# Altium integrated library Telephone.IntLib: 113 symbols (continued)
## CMP-009-00242-1
designator R?, comment value 330  (hidden comment: RC0603FR-07330RL)
Res Thick Film 0603 330 Ohm 1% 0.1W(1/10W) ±100ppm/C Pad SMD T/R; Manufacturer: Yageo; Manufacturer Part Number: RC0603FR-071K54L; Manufacturer: Mepco Philips; Voltage Rating: 50V; Max Power Dissipation: 100mW; Temperature Coefficient: 100ppm/°C; Case/Package: 0603; RoHS Compliant: Yes; Min Operating Temperature: -55°C; Max Operating Temperature: 155°C; Tolerance: 1%; Design Item ID: RC0603FR-071K54L; Case Code (Metric): 1608; Category: Chip SMD Resistors; Construction: Rectangular; Depth: 0.8mm; Features: Moisture Resistant; Height: 450um; Lead Free: Lead Free; Length: 1.6mm; Military Standard: Not; Number of Terminations: 2; Package Quantity: 1; Packaging: Cut Tape; Power Rating: 100mW; Pricing 1: 1=0.10000, 10=0.01800, 50=0.01800, 100=0.00600, 1000=0.00500, 10000=0.00300 (USD); Resistor Type: Thick Film; RoHS: Yes; Series: RC; Size Code: 0603; Stock 1: 61319; Termination: SMD/SMT; Voltage Rating (DC): 50V; Width: 800um; ComponentLink1Description: https://datasheet.ciiva.com/2454/pyu-r-int-thick-7-2454405.pdf?src-supplier=Digi-Key; ComponentLink1URL: https://datasheet.ciiva.com/2454/pyu-r-int-thick-7-2454405.pdf?src-supplier=Digi-Key; ComponentLink2Description: https://datasheet.ciiva.com/2454/pyu-r-int-thick-7-2454406.pdf?src-supplier=Digi-Key; ComponentLink2URL: https://datasheet.ciiva.com/2454/pyu-r-int-thick-7-2454406.pdf?src-supplier=Digi-Key; ComponentLink3Description: https://datasheet.ciiva.com/2454/pyu-r-int-thick-7-2454407.pdf?src-supplier=Digi-Key; ComponentLink3URL: https://datasheet.ciiva.com/2454/pyu-r-int-thick-7-2454407.pdf?src-supplier=Digi-Key; Pins: 2; Manufacturer Part Number: RC0603FR-07330RL; Component Type: Resistors
footprint R0603
pins: 1, 2

## CMP-009-00285-2
designator R?, comment value 10  (hidden comment: 1-2176230-4)
Res Thick Film 2512 10 Ohm 5% 3W ±200ppm/C Pad SMD T/R; Manufacturer: TE Connectivity CGS; Manufacturer: TE Connectivity; Manufacturer Part Number: 352210RJT; Temperature Coefficient: 200ppm/°C; Voltage Rating: 250V; Number of Resistors: 1; Manufacturer Part Number: 1-2176230-4; RoHS: Yes; Category: Uncategorized; Stock 1: 23105; Pricing 1: 1=0.73, 10=0.617, 50=0.617, 100=0.414, 1000=0.243, 10000=0.2 (USD); Mount: Surface Mount; Case/Package: 2512; Case Code (Metric): 6432; Min Operating Temperature: -55°C; Max Operating Temperature: 105°C; Packaging: Tape and Reel; Tolerance: 5%; Number of Terminations: 2; Series: 3522; Power Rating: 3W; Termination: Solder; Resistor Type: Thick Film,Power resistor; Voltage Rating (DC): 250V; Technology: THICK FILM; Resistance Tolerance: 5%; Length: 6.35mm; Height: 1.1mm; Depth: 3.2mm; RoHS Compliant: Yes; Reach SVHC Compliant: Unknown; ComponentLink1URL: http://www.farnell.com/datasheets/2007092.pdf?src-supplier=Farnell; ComponentLink1Description: http://www.farnell.com/datasheets/2007092.pdf?src-supplier=Farnell; ComponentLink2URL: http://uk.rs-online.com/webdocs/142d/0900766b8142d0f1.pdf?src-supplier=Rs; ComponentLink2Description: http://uk.rs-online.com/webdocs/142d/0900766b8142d0f1.pdf?src-supplier=Rs; ComponentLink3URL: https://www.te.com/commerce/DocumentDelivery/DDEController?Action=srchrtrv&DocNm=9-1773463-7&DocType=DS&DocLang=English&src-supplier=Digi-Key; ComponentLink3Description: https://www.te.com/commerce/DocumentDelivery/DDEController?Action=srchrtrv&DocNm=9-1773463-7&DocType=DS&DocLang=English&src-supplier=Digi-Key; ComponentLink4URL: http://www.te.com/commerce/DocumentDelivery/DDEController?Action=srchrtrv&DocNm=9-1773463-7&DocType=DS&DocLang=English&src-supplier=Digi-Key; ComponentLink4Description: http://www.te.com/commerce/DocumentDelivery/DDEController?Action=srchrtrv&DocNm=9-1773463-7&DocType=DS&DocLang=English&src-supplier=Digi-Key; ComponentLink5URL: http://www.farnell.com/datasheets/2007092.pdf?src-supplier=Newark; ComponentLink5Description: http://www.farnell.com/datasheets/2007092.pdf?src-supplier=Newark; Design Item ID: 1-2176230-4; Component Type: Standard; Pin Count: 2; Source: V4-TEL.SCHLIB; Component Type: Resistors
footprint R2512 (Molded Resistor, 2-Leads, Body 6.4x3.2mm, IPC Medium Density)
pins: 1, 2

## CMP-009-00287-2
designator R?, comment value 56  (hidden comment: 4-1879501-3)
Res Thick Film 2512 56 Ohm 5% 2W ±100ppm/°C Molded SMD SMD T/R; Manufacturer: TE Connectivity; Voltage Rating: 200V; Number of Resistors: 1; Manufacturer Part Number: 4-1879501-3; Stock: 3706; Mounting Technology: Surface Mount; Case/Package: 2512; Case Code (Metric): 6432; Min Operating Temperature: -55°C; Max Operating Temperature: 155°C; Packaging: Cut Tape; Tolerance: 5%; Temperature Coefficient: 100ppm/°C; Number of Terminations: 2; Series: CRGH; Resistor Type: Power resistor; Voltage Rating (DC): 200V; Termination: Solder; Resistance Tolerance: 5%; Technology: THICK FILM; Length: 6.35mm; Height: 0.55mm; Depth: 3.2mm; RoHS Compliant: Yes; Reach SVHC Compliant: No; ComponentLink1URL: https://datasheet.ciiva.com/12564/ng-ds-1773204-g-214560-12564976.pdf?src-supplier=Mouser; ComponentLink1Description: https://datasheet.ciiva.com/12564/ng-ds-1773204-g-214560-12564976.pdf?src-supplier=Mouser; ComponentLink2URL: https://datasheet.ciiva.com/48778/1755795-48778268.pdf?src-supplier=Element14; ComponentLink2Description: https://datasheet.ciiva.com/48778/1755795-48778268.pdf?src-supplier=Element14; ComponentLink3URL: https://datasheet.ciiva.com/48777/1755795-48777694.pdf?src-supplier=Element14; ComponentLink3Description: https://datasheet.ciiva.com/48777/1755795-48777694.pdf?src-supplier=Element14; Component Type: Standard; Pins: 2; Power: 2W; Case Code (Imperial): 2512; Component Type: Resistors
footprint R2512 (Molded Resistor, 2-Leads, Body 6.4x3.2mm, IPC Medium Density)
pins: 1, 2

## CMP-009-00289-1
designator R?  value 1.2k  (hidden comment: CMP-009-00289-1)
Res Thick Film 0805 1.2K Ohm 1% 0.125W(1/8W) ±100ppm/C Molded SMD Paper Tape on Plastic Reel; Manufacturer: Bourns; Manufacturer Part Number: CR0805-FX-1201ELF; Power Rating: 125mW; Voltage Rating: 150V; Temperature Coefficient: 100ppm/°C; RoHS: Yes; Category: Chip SMD Resistors; Stock 1: 89998; Pricing 1: 1=0.1, 10=0.029, 50=0.029, 100=0.012, 1000=0.006, 10000=0.003 (USD); Mount: Surface Mount; Case/Package: 0805; Case Code (Metric): 2012; Contact Plating: Tin; Min Operating Temperature: -55°C; Max Operating Temperature: 155°C; Package Quantity: 5000; Packaging: Tape and Reel; Tolerance: 1%; Number of Terminations: 2; Termination: SMD/SMT; Max Power Dissipation: 125mW; Features: Moisture Resistant; Series: CR0805; Length: 0.079inch; Width: 1.25mm; Height: 0.024inch; Thickness: 508um; Radiation Hardening: No; RoHS Compliant: Yes; ComponentLink1URL: https://datasheet.ciiva.com/9123/chpreztr-9123541.pdf?src-supplier=Avnet; ComponentLink1Description: https://datasheet.ciiva.com/9123/chpreztr-9123541.pdf?src-supplier=Avnet; ComponentLink2URL: https://datasheet.ciiva.com/5581/chpreztr-5581383.pdf?src-supplier=Mouser; ComponentLink2Description: https://datasheet.ciiva.com/5581/chpreztr-5581383.pdf?src-supplier=Mouser; Design Item ID: CR0805-FX-1201ELF; Component Type: Standard; Pin Count: 2; Source: V4-TEL.SCHLIB; Component Type: Resistors
footprint 0805
pins: 1, 2

## CMP-009-00290-1
designator R?  value 13  (hidden comment: CMP-009-00290-1)
Res Thick Film 0805 13 Ohm 1% 1/8W ±100ppm/°C Molded SMD SMD Paper Tape on Plastic Reel; Manufacturer: Bourns; Manufacturer Part Number: CR0805-FX-13R0ELF; Power Rating: 125mW; Voltage Rating: 150V; RoHS: Yes; Category: Chip SMD Resistors; Stock 1: 53715; Pricing 1: 1=0.1, 10=0.029, 50=0.029, 100=0.012, 1000=0.006, 10000=0.003 (USD); Mount: Surface Mount; Case/Package: 0805; Case Code (Metric): 2012; Contact Plating: Tin; Min Operating Temperature: -55°C; Max Operating Temperature: 155°C; Packaging: Tape and Reel; Tolerance: 1%; Package Quantity: 5000; Number of Terminations: 2; Termination: SMD/SMT; Temperature Coefficient: 100ppm/°C; Max Power Dissipation: 125mW; Features: Moisture Resistant; Series: CR0805; Length: 0.079inch; Width: 1.25mm; Height: 0.024inch; Thickness: 508um; Radiation Hardening: No; RoHS Compliant: Yes; ComponentLink1URL: https://datasheet.ciiva.com/5577/chpreztr-5577813.pdf?src-supplier=Mouser; ComponentLink1Description: https://datasheet.ciiva.com/5577/chpreztr-5577813.pdf?src-supplier=Mouser; ComponentLink2URL: https://datasheet.ciiva.com/9122/chpreztr-9122173.pdf?src-supplier=Avnet; ComponentLink2Description: https://datasheet.ciiva.com/9122/chpreztr-9122173.pdf?src-supplier=Avnet; Design Item ID: CR0805-FX-13R0ELF; Component Type: Standard; Pin Count: 2; Source: V4-TEL.SCHLIB; Component Type: Resistors
footprint 0805
pins: 1, 2

## CMP-009-00291-1
designator R?  value 200  (hidden comment: CMP-009-00291-1)
Res Thick Film 0805 200 Ohm 1% 1/8W ±100ppm/°C Molded SMD SMD Paper Tape on Plastic Reel; Manufacturer: Bourns; Manufacturer Part Number: CR0805-FX-2000ELF; Power Rating: 125mW; Voltage Rating: 150V; RoHS: Yes; Category: Chip SMD Resistors; Stock 1: 115698; Pricing 1: 1=0.1, 10=0.029, 50=0.029, 100=0.012, 1000=0.006, 10000=0.003 (USD); Mount: Surface Mount; Case/Package: 0805; Case Code (Metric): 2012; Contact Plating: Tin; Min Operating Temperature: -55°C; Max Operating Temperature: 155°C; Packaging: Tape and Reel; Tolerance: 1%; Package Quantity: 5000; Termination: SMD/SMT; Temperature Coefficient: 100ppm/°C; Features: Moisture Resistant; Series: CR0805; Max Power Dissipation: 125mW; Number of Terminations: 2; Length: 2mm; Width: 1.25mm; Height: 0.5mm; Thickness: 508um; Radiation Hardening: No; RoHS Compliant: Yes; ComponentLink1URL: http://components.arrow.com/part/dataview/40998293S2126022N1506?src-supplier=Arrow+Electronics; ComponentLink1Description: http://components.arrow.com/part/dataview/40998293S2126022N1506?src-supplier=Arrow+Electronics; ComponentLink2URL: http://www.farnell.com/datasheets/2178762.pdf?src-supplier=Farnell; ComponentLink2Description: http://www.farnell.com/datasheets/2178762.pdf?src-supplier=Farnell; ComponentLink3URL: http://www.mouser.com/ds/2/54/chpreztr-977002.pdf?src-supplier=Mouser; ComponentLink3Description: http://www.mouser.com/ds/2/54/chpreztr-977002.pdf?src-supplier=Mouser; ComponentLink4URL: http://www.farnell.com/datasheets/2178762.pdf?src-supplier=Newark; ComponentLink4Description: http://www.farnell.com/datasheets/2178762.pdf?src-supplier=Newark; ComponentLink5URL: http://www.bourns.com/pdfs/chpreztr.pdf?src-supplier=Avnet; ComponentLink5Description: http://www.bourns.com/pdfs/chpreztr.pdf?src-supplier=Avnet; ComponentLink6URL: https://www.bourns.com/docs/Product-Datasheets/CHPREZTR.pdf?src-supplier=Digi-Key; ComponentLink6Description: https://www.bourns.com/docs/Product-Datasheets/CHPREZTR.pdf?src-supplier=Digi-Key; ComponentLink7URL: http://www.onlinecomponents.com/datasheet/cr0805-fx-2000elf.aspx?p=10745564&src-supplier=Onlinecomponents.com; ComponentLink7Description: http://www.onlinecomponents.com/datasheet/cr0805-fx-2000elf.aspx?p=10745564&src-supplier=Onlinecomponents.com; Design Item ID: CR0805-FX-2000ELF; Component Type: Standard; Pin Count: 2; Source: V4-TEL.SCHLIB; Component Type: Resistors
footprint 0805
pins: 1, 2

## CMP-009-00292-1
designator R?  value 2.7k  (hidden comment: CMP-009-00292-1)
Res Thick Film 0805 2.7K Ohm 1% 1/8W ±100ppm/°C Molded SMD SMD Paper Tape on Plastic Reel; Manufacturer: Bourns; Manufacturer Part Number: CR0805-FX-2701ELF; Power Rating: 125mW; Voltage Rating: 150V; RoHS: Yes; Category: Chip SMD Resistors; Stock 1: 44241; Pricing 1: 1=0.1, 10=0.029, 50=0.029, 100=0.012, 1000=0.006, 10000=0.003 (USD); Mount: Surface Mount; Case/Package: 0805; Case Code (Metric): 2012; Contact Plating: Tin; Min Operating Temperature: -55°C; Max Operating Temperature: 155°C; Packaging: Tape and Reel; Package Quantity: 5000; Tolerance: 1%; Termination: SMD/SMT; Number of Terminations: 2; Temperature Coefficient: 100ppm/°C; Max Power Dissipation: 125mW; Features: Moisture Resistant; Series: CR0805; Length: 0.079inch; Width: 1.25mm; Height: 0.024inch; Thickness: 508um; Radiation Hardening: No; RoHS Compliant: Yes; ComponentLink1URL: https://datasheet.ciiva.com/9123/chpreztr-9123127.pdf?src-supplier=Avnet; ComponentLink1Description: https://datasheet.ciiva.com/9123/chpreztr-9123127.pdf?src-supplier=Avnet; ComponentLink2URL: https://datasheet.ciiva.com/18608/chpreztr-18608504.pdf?src-supplier=Digi-Key; ComponentLink2Description: https://datasheet.ciiva.com/18608/chpreztr-18608504.pdf?src-supplier=Digi-Key; ComponentLink3URL: https://datasheet.ciiva.com/18608/chpreztr-18608505.pdf?src-supplier=Digi-Key; ComponentLink3Description: https://datasheet.ciiva.com/18608/chpreztr-18608505.pdf?src-supplier=Digi-Key; ComponentLink4URL: https://datasheet.ciiva.com/18608/chpreztr-18608506.pdf?src-supplier=Digi-Key; ComponentLink4Description: https://datasheet.ciiva.com/18608/chpreztr-18608506.pdf?src-supplier=Digi-Key; Design Item ID: CR0805-FX-2701ELF; Component Type: Standard; Pin Count: 2; Source: V4-TEL.SCHLIB; Component Type: Resistors
footprint 0805
pins: 1, 2

## CMP-009-00293-1
designator R?  value 300  (hidden comment: CMP-009-00293-1)
Res Thick Film 0805 300 Ohm 1% 1/8W ±100ppm/°C Molded SMD SMD Paper Tape on Plastic Reel; Manufacturer: Bourns; Manufacturer Part Number: CR0805-FX-3000ELF; Power Rating: 125mW; Voltage Rating: 150V; RoHS: Yes; Category: Chip SMD Resistors; Stock 1: 32741; Pricing 1: 1=0.1, 10=0.034, 50=0.034, 100=0.014, 1000=0.007, 10000=0.003 (USD); Mount: Surface Mount; Case/Package: 0805; Case Code (Metric): 2012; Contact Plating: Tin; Min Operating Temperature: -55°C; Max Operating Temperature: 155°C; Packaging: Tape and Reel; Tolerance: 1%; Package Quantity: 1; Termination: SMD/SMT; Number of Terminations: 2; Temperature Coefficient: 100ppm/°C; Max Power Dissipation: 125mW; Features: Moisture Resistant; Series: CR0805; Length: 0.079inch; Width: 1.25mm; Height: 0.024inch; Thickness: 508um; Radiation Hardening: No; RoHS Compliant: Yes; ComponentLink1URL: https://datasheet.ciiva.com/18608/chpreztr-18608507.pdf?src-supplier=Digi-Key; ComponentLink1Description: https://datasheet.ciiva.com/18608/chpreztr-18608507.pdf?src-supplier=Digi-Key; ComponentLink2URL: https://datasheet.ciiva.com/18608/chpreztr-18608508.pdf?src-supplier=Digi-Key; ComponentLink2Description: https://datasheet.ciiva.com/18608/chpreztr-18608508.pdf?src-supplier=Digi-Key; ComponentLink3URL: https://datasheet.ciiva.com/18608/chpreztr-18608509.pdf?src-supplier=Digi-Key; ComponentLink3Description: https://datasheet.ciiva.com/18608/chpreztr-18608509.pdf?src-supplier=Digi-Key; Design Item ID: CR0805-FX-3000ELF; Component Type: Standard; Pin Count: 2; Source: V4-TEL.SCHLIB; Component Type: Resistors
footprint 0805
pins: 1, 2

## CMP-009-00294-1
designator R?  value 1.5M  (hidden comment: CMP-009-00294-1)
Thick Film Resistors 1.5M 5%; Manufacturer: Bourns; Manufacturer Part Number: CR0805-JW-155ELF; Power Rating: 125mW; Voltage Rating: 150V; Temperature Coefficient: 200ppm/°C; RoHS: Yes; Category: Chip SMD Resistors; Stock 1: 77505; Pricing 1: 1=0.1, 10=0.024, 50=0.024, 100=0.01, 1000=0.005, 10000=0.004 (USD); Mount: Surface Mount; Case/Package: 0805; Case Code (Metric): 2012; Contact Plating: Tin; Min Operating Temperature: -55°C; Max Operating Temperature: 155°C; Packaging: Tape and Reel; Package Quantity: 5000; Tolerance: 5%; Termination: SMD/SMT; Number of Terminations: 2; Max Power Dissipation: 125mW; Features: Moisture Resistant; Series: CR0805; Length: 0.079inch; Width: 1.25mm; Height: 0.024inch; Thickness: 508um; Radiation Hardening: No; RoHS Compliant: Yes; ComponentLink1URL: https://datasheet.ciiva.com/5545/chpreztr-5545126.pdf?src-supplier=Mouser; ComponentLink1Description: https://datasheet.ciiva.com/5545/chpreztr-5545126.pdf?src-supplier=Mouser; ComponentLink2URL: https://datasheet.ciiva.com/18608/chpreztr-18608456.pdf?src-supplier=Digi-Key; ComponentLink2Description: https://datasheet.ciiva.com/18608/chpreztr-18608456.pdf?src-supplier=Digi-Key; ComponentLink3URL: https://datasheet.ciiva.com/18608/chpreztr-18608457.pdf?src-supplier=Digi-Key; ComponentLink3Description: https://datasheet.ciiva.com/18608/chpreztr-18608457.pdf?src-supplier=Digi-Key; ComponentLink4URL: https://datasheet.ciiva.com/18608/chpreztr-18608458.pdf?src-supplier=Digi-Key; ComponentLink4Description: https://datasheet.ciiva.com/18608/chpreztr-18608458.pdf?src-supplier=Digi-Key; ComponentLink5URL: https://datasheet.ciiva.com/9123/chpreztr-9123419.pdf?src-supplier=Avnet; ComponentLink5Description: https://datasheet.ciiva.com/9123/chpreztr-9123419.pdf?src-supplier=Avnet; Design Item ID: CR0805-JW-155ELF; Component Type: Standard; Pin Count: 2; Source: V4-TEL.SCHLIB; Component Type: Resistors
footprint 0805
pins: 1, 2

## CMP-009-00295-1
designator R?  value 2k  (hidden comment: CMP-009-00295-1)
Res Thick Film 0805 2K Ohm 5% 1/8W ±200ppm/°C Molded SMD SMD Paper Tape on Plastic Reel; Manufacturer: Bourns; Manufacturer Part Number: CR0805-JW-202ELF; Power Rating: 125mW; Voltage Rating: 150V; RoHS: Yes; Category: Chip SMD Resistors; Stock 1: 147283; Pricing 1: 1=0.1, 10=0.024, 50=0.024, 100=0.01, 1000=0.005, 10000=0.003 (USD); Mount: Surface Mount; Case/Package: 0805; Case Code (Metric): 2012; Contact Plating: Tin; Min Operating Temperature: -55°C; Max Operating Temperature: 155°C; Tolerance: 5%; Packaging: Tape and Reel; Package Quantity: 1; Resistor Type: Thick Film; Termination: SMD/SMT; Number of Terminations: 2; Temperature Coefficient: 200ppm/°C; Max Power Dissipation: 125mW; Voltage Rating (DC): 150V; Features: Moisture Resistant; Series: CR0805; Resistance Tolerance: 5%; Length: 0.079inch; Width: 1.25mm; Height: 0.024inch; Thickness: 508um; Radiation Hardening: No; Reach SVHC Compliant: No; RoHS Compliant: Yes; ComponentLink1URL: https://datasheet.ciiva.com/18594/chpreztr-18594853.pdf?src-supplier=Digi-Key; ComponentLink1Description: https://datasheet.ciiva.com/18594/chpreztr-18594853.pdf?src-supplier=Digi-Key; ComponentLink2URL: https://datasheet.ciiva.com/18594/chpreztr-18594854.pdf?src-supplier=Digi-Key; ComponentLink2Description: https://datasheet.ciiva.com/18594/chpreztr-18594854.pdf?src-supplier=Digi-Key; ComponentLink3URL: https://datasheet.ciiva.com/18594/chpreztr-18594855.pdf?src-supplier=Digi-Key; ComponentLink3Description: https://datasheet.ciiva.com/18594/chpreztr-18594855.pdf?src-supplier=Digi-Key; Design Item ID: CR0805-JW-202ELF; Component Type: Standard; Pin Count: 2; Source: V4-TEL.SCHLIB; Component Type: Resistors
footprint 0805
pins: 1, 2

## CMP-009-00296-1
designator R?  value 2.2k  (hidden comment: CMP-009-00296-1)
Res Thick Film 0805 2.2K Ohm 5% 1/8W ±200ppm/°C Molded SMD SMD Paper Tape on Plastic Reel; Manufacturer: Bourns; Manufacturer Part Number: CR0805-JW-222ELF; Power Rating: 125mW; Voltage Rating: 150V; RoHS: Yes; Category: Chip SMD Resistors; Stock 1: 107619; Pricing 1: 1=0.1, 10=0.024, 50=0.024, 100=0.01, 1000=0.005, 10000=0.003 (USD); Mount: Surface Mount; Case/Package: 0805; Case Code (Metric): 2012; Contact Plating: Tin; Min Operating Temperature: -55°C; Max Operating Temperature: 155°C; Packaging: Tape and Reel; Tolerance: 5%; Package Quantity: 1; Resistor Type: Thick Film; Termination: SMD/SMT; Number of Terminations: 2; Temperature Coefficient: 200ppm/°C; Max Power Dissipation: 125mW; Voltage Rating (DC): 150V; Features: Moisture Resistant; Series: CR0805; Resistance Tolerance: 5%; Length: 0.079inch; Width: 1.25mm; Height: 0.024inch; Thickness: 508um; Radiation Hardening: No; Reach SVHC Compliant: No; RoHS Compliant: Yes; ComponentLink1URL: https://datasheet.ciiva.com/5547/chpreztr-26488-5547975.pdf?src-supplier=Mouser; ComponentLink1Description: https://datasheet.ciiva.com/5547/chpreztr-26488-5547975.pdf?src-supplier=Mouser; ComponentLink2URL: https://datasheet.ciiva.com/6547/chpreztr-6547353.pdf?src-supplier=Digi-Key; ComponentLink2Description: https://datasheet.ciiva.com/6547/chpreztr-6547353.pdf?src-supplier=Digi-Key; ComponentLink3URL: https://datasheet.ciiva.com/6547/chpreztr-6547354.pdf?src-supplier=Digi-Key; ComponentLink3Description: https://datasheet.ciiva.com/6547/chpreztr-6547354.pdf?src-supplier=Digi-Key; ComponentLink4URL: https://datasheet.ciiva.com/6547/chpreztr-6547355.pdf?src-supplier=Digi-Key; ComponentLink4Description: https://datasheet.ciiva.com/6547/chpreztr-6547355.pdf?src-supplier=Digi-Key; Design Item ID: CR0805-JW-222ELF; Component Type: Standard; Pin Count: 2; Source: V4-TEL.SCHLIB; Component Type: Resistors
footprint 0805
pins: 1, 2

## CMP-009-00298-1
designator R?  value 1.5k  (hidden comment: CMP-009-00298-1)
Res Thick Film 0805 1.5K Ohm 5% 1/8W ±200ppm/°C Molded SMD SMD Paper T/R; Manufacturer: Vishay Dale; Manufacturer Part Number: CRCW08051K50JNEA; Power Rating: 125mW; Voltage Rating: 150V; RoHS: Yes; Category: Chip SMD Resistors; Stock 1: 18838; Pricing 1: 1=0.1, 10=0.05, 50=0.05, 100=0.021, 1000=0.01, 10000=0.006 (USD); Case/Package: 0805; Weight: 0.000194oz; Case Code (Metric): 2012; Contact Plating: Tin; Size Code: 0805; Min Operating Temperature: -55°C; Max Operating Temperature: 155°C; Tolerance: 5%; Packaging: Tape and Reel; Package Quantity: 5000; Termination: SMD/SMT; Resistor Type: Thick Film; Temperature Coefficient: 200ppm/°C; Voltage Rating (DC): 150V; Features: Automotive AEC-Q200; Series: CRCW; Max Power Dissipation: 125mW; Number of Terminations: 2; Construction: Rectangular; Resistance Tolerance: 5%; Length: 2mm; Width: 1.25mm; Height: 0.45mm; Depth: 1.25mm; Radiation Hardening: No; Military Standard: Not; Lead Free: Lead Free; RoHS Compliant: Yes; Reach SVHC Compliant: Unknown; ComponentLink1URL: https://datasheet.ciiva.com/16780/70201119-16780055.pdf?src-supplier=Allied+Electronics; ComponentLink1Description: https://datasheet.ciiva.com/16780/70201119-16780055.pdf?src-supplier=Allied+Electronics; ComponentLink2URL: https://datasheet.ciiva.com/9100/dcrcwe3-9100360.pdf?src-supplier=Avnet; ComponentLink2Description: https://datasheet.ciiva.com/9100/dcrcwe3-9100360.pdf?src-supplier=Avnet; Design Item ID: CRCW08051K50JNEA; Component Type: Standard; Pin Count: 2; Source: V4-TEL.SCHLIB; Component Type: Resistors
footprint 0805
pins: 1, 2

## CMP-009-00299-1
designator R?  value 1.8k  (hidden comment: CMP-009-00299-1)
Res Thick Film 0805 1.8K Ohm 5% 1/8W ±200ppm/°C Molded SMD SMD Paper T/R; Manufacturer: Vishay Dale; Manufacturer Part Number: CRCW08051K80JNEA; Power Rating: 125mW; Voltage Rating: 150V; RoHS: Yes; Category: Chip SMD Resistors; Stock 1: 4900; Pricing 1: 1=0.1, 10=0.05, 50=0.05, 100=0.021, 1000=0.01, 10000=0.005 (USD); Case/Package: 0805; Contact Plating: Tin; Weight: 0.000194oz; Case Code (Metric): 2012; Size Code: 0805; Min Operating Temperature: -55°C; Max Operating Temperature: 155°C; Tolerance: 5%; Temperature Coefficient: 200ppm/°C; Packaging: Cut Tape; Resistor Type: Thick Film; Number of Terminations: 2; Termination: SMD/SMT; Max Power Dissipation: 125mW; Features: Automotive AEC-Q200; Series: CRCW; Package Quantity: 1; Voltage Rating (DC): 150V; Resistance Tolerance: 5%; Length: 0.079inch; Width: 0.049inch; Height: 0.02inch; Radiation Hardening: No; Lead Free: Lead Free; RoHS Compliant: Yes; Reach SVHC Compliant: Unknown; ComponentLink1URL: https://datasheet.ciiva.com/2464/dcrcwe3-2464848.pdf?src-supplier=Digi-Key; ComponentLink1Description: https://datasheet.ciiva.com/2464/dcrcwe3-2464848.pdf?src-supplier=Digi-Key; ComponentLink2URL: https://datasheet.ciiva.com/22872/70201119-22872346.pdf?src-supplier=Allied+Electronics; ComponentLink2Description: https://datasheet.ciiva.com/22872/70201119-22872346.pdf?src-supplier=Allied+Electronics; ComponentLink3URL: https://datasheet.ciiva.com/16390/dcrcw-16390924.pdf?src-supplier=Future+Electronics; ComponentLink3Description: https://datasheet.ciiva.com/16390/dcrcw-16390924.pdf?src-supplier=Future+Electronics; ComponentLink4URL: https://datasheet.ciiva.com/3258/dcrcwe3-3258269.pdf?src-supplier=Avnet; ComponentLink4Description: https://datasheet.ciiva.com/3258/dcrcwe3-3258269.pdf?src-supplier=Avnet; ComponentLink5URL: https://datasheet.ciiva.com/2464/dcrcwe3-2464846.pdf?src-supplier=Digi-Key; ComponentLink5Description: https://datasheet.ciiva.com/2464/dcrcwe3-2464846.pdf?src-supplier=Digi-Key; ComponentLink6URL: https://datasheet.ciiva.com/3258/dcrcwe3-3258270.pdf?src-supplier=Avnet; ComponentLink6Description: https://datasheet.ciiva.com/3258/dcrcwe3-3258270.pdf?src-supplier=Avnet; ComponentLink7URL: https://datasheet.ciiva.com/2464/dcrcwe3-2464847.pdf?src-supplier=Digi-Key; ComponentLink7Description: https://datasheet.ciiva.com/2464/dcrcwe3-2464847.pdf?src-supplier=Digi-Key; Design Item ID: CRCW08051K80JNEA; Component Type: Standard; Pin Count: 2; Source: V4-TEL.SCHLIB; Component Type: Resistors
footprint 0805
pins: 1, 2

## CMP-009-00300-1
designator R?  value 1 M  (hidden comment: CMP-009-00300-1)
Res Thick Film 0805 1M Ohm 5% 0.125W(1/8W) ±200ppm/°C Pad SMD T/R; Manufacturer: Vishay; Manufacturer Part Number: CRCW08051M00JNEAC; RoHS: No; Category: Chip SMD Resistors; Stock 1: 24891; Pricing 1: 1=0.1, 10=0.042, 50=0.042, 100=0.017, 1000=0.008, 10000=0.005 (USD); Design Item ID: CRCW08051M00JNEAC; Component Type: Standard; Pin Count: 2; Source: V4-TEL.SCHLIB; Component Type: Resistors
footprint 0805
pins: 1, 2

## CMP-009-00301-2
designator R?, comment value 680  (hidden comment: CRCW0805680RJNEBC)
CRCW Thick Film Commodity Chip Resistor 0805 Size 680 Ohm 5% 0.125 W 200 ppm/K 2-Pin SMD Paper T/R; Manufacturer: Vishay; Power: 125mW; Manufacturer Part Number: CRCW0805680RJNEBC; Category: Chip SMD Resistors; Mounting Technology: SMT; Pins: 2; RoHS Compliant: No; Tolerance: 5%; Component Type: Resistors
footprint R0805
pins: 1, 2

## CMP-009-00302-1
designator R?  value 8.2k  (hidden comment: CMP-009-00302-1)
Res Thick Film 0805 8.2K Ohm 5% 1/8W ±200ppm/°C Molded SMD SMD Paper T/R; Manufacturer: Vishay Dale; Manufacturer Part Number: CRCW08058K20JNEA; Power Rating: 125mW; Voltage Rating: 150V; RoHS: Yes; Category: Chip SMD Resistors; Stock 1: 5125; Pricing 1: 1=0.1, 10=0.05, 50=0.05, 100=0.021, 1000=0.01, 10000=0.006 (USD); Case/Package: 0805; Weight: 0.000194oz; Case Code (Metric): 2012; Contact Plating: Tin; Size Code: 0805; Min Operating Temperature: -55°C; Max Operating Temperature: 155°C; Tolerance: 5%; Packaging: Tape and Reel; Package Quantity: 1; Resistor Type: Thick Film; Number of Terminations: 2; Max Power Dissipation: 125mW; Temperature Coefficient: 200ppm/°C; Voltage Rating (DC): 150V; Features: Automotive AEC-Q200; Series: CRCW; Resistance Tolerance: 5%; Termination: SMD/SMT; Technology: THICK FILM; Length: 2mm; Width: 0.049inch; Height: 0.45mm; Depth: 1.25mm; Radiation Hardening: No; Lead Free: Lead Free; RoHS Compliant: Yes; Reach SVHC Compliant: Unknown; ComponentLink1URL: https://datasheet.ciiva.com/2464/dcrcwe3-2464855.pdf?src-supplier=Digi-Key; ComponentLink1Description: https://datasheet.ciiva.com/2464/dcrcwe3-2464855.pdf?src-supplier=Digi-Key; ComponentLink2URL: https://datasheet.ciiva.com/2464/dcrcwe3-2464856.pdf?src-supplier=Digi-Key; ComponentLink2Description: https://datasheet.ciiva.com/2464/dcrcwe3-2464856.pdf?src-supplier=Digi-Key; ComponentLink3URL: https://datasheet.ciiva.com/2464/dcrcwe3-2464857.pdf?src-supplier=Digi-Key; ComponentLink3Description: https://datasheet.ciiva.com/2464/dcrcwe3-2464857.pdf?src-supplier=Digi-Key; ComponentLink4URL: https://datasheet.ciiva.com/16397/dcrcwe3-16397273.pdf?src-supplier=Future+Electronics; ComponentLink4Description: https://datasheet.ciiva.com/16397/dcrcwe3-16397273.pdf?src-supplier=Future+Electronics; ComponentLink5URL: https://datasheet.ciiva.com/5550/dcrcwe3-109170-5550397.pdf?src-supplier=Mouser; ComponentLink5Description: https://datasheet.ciiva.com/5550/dcrcwe3-109170-5550397.pdf?src-supplier=Mouser; ComponentLink6URL: https://datasheet.ciiva.com/9056/dcrcwe3-9056269.pdf?src-supplier=Avnet; ComponentLink6Description: https://datasheet.ciiva.com/9056/dcrcwe3-9056269.pdf?src-supplier=Avnet; ComponentLink7URL: https://datasheet.ciiva.com/16773/70201119-16773566.pdf?src-supplier=Allied+Electronics; ComponentLink7Description: https://datasheet.ciiva.com/16773/70201119-16773566.pdf?src-supplier=Allied+Electronics; ComponentLink8URL: https://datasheet.ciiva.com/9056/dcrcwe3-9056271.pdf?src-supplier=Avnet; ComponentLink8Description: https://datasheet.ciiva.com/9056/dcrcwe3-9056271.pdf?src-supplier=Avnet; Design Item ID: CRCW08058K20JNEA; Component Type: Standard; Pin Count: 2; Source: V4-TEL.SCHLIB; Component Type: Resistors
footprint 0805
pins: 1, 2

## CMP-009-00303-1
designator R?  value 30  (hidden comment: CMP-009-00303-1)
Res Thick Film 0603 30 Ohm 1% 0.2W(1/5W) ±200ppm/°C Molded SMD Punched Carrier T/R; Manufacturer: Panasonic; Manufacturer Part Number: ERJP03F30R0V; Power Rating: 200mW; Voltage Rating: 150V; RoHS: Yes; Category: Chip SMD Resistors; Stock 1: 2224; Pricing 1: 1=0.36, 10=0.264, 50=0.264, 100=0.126, 1000=0.052, 10000=0.04 (USD); Mount: Surface Mount; Case/Package: 0603; Case Code (Metric): 1608; Min Operating Temperature: -55°C; Max Operating Temperature: 155°C; Tolerance: 1%; Packaging: Tape and Reel; Package Quantity: 5000; Resistor Type: Thick Film; Temperature Coefficient: 200ppm/°C; Voltage Rating (DC): 150V; Termination: Tab; Features: Automotive AEC-Q200; Series: ERJ; Max Power Dissipation: 200mW; Number of Terminations: 2; Resistance Tolerance: 1%; Technology: THICK FILM; Length: 1.6mm; Width: 0.8mm; Height: 0.45mm; Depth: 0.8mm; Ratings: AEC-Q200; Reach SVHC Compliant: No; RoHS Compliant: Yes; ComponentLink1URL: https://datasheet.ciiva.com/11817/0900766b812cb812-11817099.pdf?src-supplier=Rs; ComponentLink1Description: https://datasheet.ciiva.com/11817/0900766b812cb812-11817099.pdf?src-supplier=Rs; ComponentLink2URL: https://datasheet.ciiva.com/48426/erjp-series-eng-tds-48426890.pdf?src-supplier=Distrelec; ComponentLink2Description: https://datasheet.ciiva.com/48426/erjp-series-eng-tds-48426890.pdf?src-supplier=Distrelec; ComponentLink3URL: https://datasheet.ciiva.com/48537/erjp-series-eng-tds-48537514.pdf?src-supplier=Distrelec; ComponentLink3Description: https://datasheet.ciiva.com/48537/erjp-series-eng-tds-48537514.pdf?src-supplier=Distrelec; ComponentLink4URL: https://datasheet.ciiva.com/22739/1790600-22739766.pdf?src-supplier=Element14; ComponentLink4Description: https://datasheet.ciiva.com/22739/1790600-22739766.pdf?src-supplier=Element14; ComponentLink5URL: https://datasheet.ciiva.com/24032/aoa0000ce4-64075-24032235.pdf?src-supplier=Mouser; ComponentLink5Description: https://datasheet.ciiva.com/24032/aoa0000ce4-64075-24032235.pdf?src-supplier=Mouser; Pins: 2; Design Item ID: ERJP03F30R0V; Component Type: Standard; Pin Count: 2; Source: V4-TEL.SCHLIB; Component Type: Resistors
footprint 0603
pins: 1, 2

## CMP-009-00305-1
designator R?  value 0  (hidden comment: CMP-009-00305-1)
RC Series 0805 0.125 W 0 Ohm Jumper SMT Thick Film Chip Resistor; Manufacturer: Yageo; Manufacturer Part Number: RC0805FR-070RL; Tolerance: 1%; Power Rating: 125mW; RoHS: Yes; Category: Chip SMD Resistors; Stock 1: 550673; Pricing 1: 1=0.1, 10=0.039, 50=0.039, 100=0.016, 1000=0.008, 10000=0.004 (USD); Case/Package: 0805; Contact Plating: Tin,Matte; Case Code (Metric): 2012; Size Code: 0805; Min Operating Temperature: -55°C; Max Operating Temperature: 155°C; Packaging: Tape and Reel; Features: Moisture Resistant; Series: RC; Max Power Dissipation: 125mW; Number of Terminations: 2; Construction: Rectangular; Length: 2mm; Depth: 1.25mm; Military Standard: Not; Lead Free: Lead Free; RoHS Compliant: Yes; ComponentLink1URL: https://datasheet.ciiva.com/15189/getdatasheetpartid-348154-15189885.pdf?src-supplier=Verical; ComponentLink1Description: https://datasheet.ciiva.com/15189/getdatasheetpartid-348154-15189885.pdf?src-supplier=Verical; ComponentLink2URL: https://datasheet.ciiva.com/17042/rc0805-17042698.pdf?src-supplier=Future+Electronics; ComponentLink2Description: https://datasheet.ciiva.com/17042/rc0805-17042698.pdf?src-supplier=Future+Electronics; Design Item ID: RC0805FR-070RL; Component Type: Standard; Pin Count: 2; Source: V4-TEL.SCHLIB; Component Type: Resistors
footprint 0805
pins: 1, 2

## CMP-009-00306-1
designator R?  value 12k  (hidden comment: CMP-009-00306-1)
Res Thick Film 0805 12K Ohm 1% 0.125W(1/8W) ±100ppm/C Pad SMD T/R; Manufacturer: Yageo; Manufacturer Part Number: RC0805FR-0712KL; Temperature Coefficient: 100ppm/°C; Power Rating: 125mW; Voltage Rating: 150V; RoHS: Yes; Category: Chip SMD Resistors; Stock 1: 240573; Pricing 1: 1=0.1, 10=0.024, 50=0.024, 100=0.012, 1000=0.007, 10000=0.004 (USD); Case/Package: 0805; Case Code (Metric): 2012; Weight: 0.000194oz; Size Code: 0805; Min Operating Temperature: -55°C; Max Operating Temperature: 155°C; Tolerance: 1%; Packaging: Cut Tape; Resistor Type: Thick Film; Package Quantity: 1; Termination: SMD/SMT; Number of Terminations: 2; Max Power Dissipation: 125mW; Features: Moisture Resistant; Series: RC; Resistance Tolerance: 1%; Length: 0.079inch; Width: 0.049inch; Height: 0.024inch; Lead Free: Lead Free; Reach SVHC Compliant: Unknown; RoHS Compliant: Yes; ComponentLink1URL: https://datasheet.ciiva.com/2519/pyu-r-int-thick-7-2519832.pdf?src-supplier=Digi-Key; ComponentLink1Description: https://datasheet.ciiva.com/2519/pyu-r-int-thick-7-2519832.pdf?src-supplier=Digi-Key; ComponentLink2URL: https://datasheet.ciiva.com/2519/pyu-r-int-thick-7-2519833.pdf?src-supplier=Digi-Key; ComponentLink2Description: https://datasheet.ciiva.com/2519/pyu-r-int-thick-7-2519833.pdf?src-supplier=Digi-Key; ComponentLink3URL: https://datasheet.ciiva.com/2519/pyu-r-int-thick-7-2519831.pdf?src-supplier=Digi-Key; ComponentLink3Description: https://datasheet.ciiva.com/2519/pyu-r-int-thick-7-2519831.pdf?src-supplier=Digi-Key; ComponentLink4URL: https://datasheet.ciiva.com/12577/rc0805-12577253.pdf?src-supplier=Mouser; ComponentLink4Description: https://datasheet.ciiva.com/12577/rc0805-12577253.pdf?src-supplier=Mouser; ComponentLink5URL: https://datasheet.ciiva.com/7941/444164-7941693.pdf?src-supplier=Element14; ComponentLink5Description: https://datasheet.ciiva.com/7941/444164-7941693.pdf?src-supplier=Element14; ComponentLink6URL: https://datasheet.ciiva.com/7941/444164-7941694.pdf?src-supplier=Element14; ComponentLink6Description: https://datasheet.ciiva.com/7941/444164-7941694.pdf?src-supplier=Element14; ComponentLink7URL: https://datasheet.ciiva.com/17018/rc0805-17018634.pdf?src-supplier=Future+Electronics; ComponentLink7Description: https://datasheet.ciiva.com/17018/rc0805-17018634.pdf?src-supplier=Future+Electronics; Design Item ID: RC0805FR-0712KL; Component Type: Standard; Pin Count: 2; Source: V4-TEL.SCHLIB; Component Type: Resistors
footprint 0805
pins: 1, 2

## CMP-009-00307-1
designator R?  value 200k  (hidden comment: CMP-009-00307-1)
Res Thick Film 0805 200K Ohm 1% 1/8W ±100ppm/°C Molded SMD Paper T/R; Manufacturer: Yageo; Manufacturer Part Number: RC0805FR-07200KL; Power Rating: 125mW; Voltage Rating: 150V; RoHS: Yes; Category: Chip SMD Resistors; Stock 1: 312674; Pricing 1: 1=0.1, 10=0.033, 50=0.033, 100=0.014, 1000=0.006, 10000=0.003 (USD); Case/Package: 0805; Case Code (Metric): 2012; Contact Plating: Tin,Matte; Min Operating Temperature: -55°C; Max Operating Temperature: 155°C; Tolerance: 1%; Packaging: Tape and Reel; Termination: SMD/SMT; Resistor Type: Thick Film; Temperature Coefficient: 100ppm/°C; Voltage Rating (DC): 150V; Working Voltage: 150V; Number of Terminations: 2; Features: Moisture Resistant; Series: RC; Max Power Dissipation: 125mW; Resistance Tolerance: 1%; Technology: THICK FILM; Construction: Rectangular; Length: 2mm; Height: 0.5mm; Depth: 1.25mm; Reach SVHC Compliant: No; Military Standard: Not; Lead Free: Lead Free; RoHS Compliant: Yes; ComponentLink1URL: https://datasheet.ciiva.com/46395/444164-46395126.pdf?src-supplier=Element14; ComponentLink1Description: https://datasheet.ciiva.com/46395/444164-46395126.pdf?src-supplier=Element14; ComponentLink2URL: https://datasheet.ciiva.com/12668/rc0805-12668200.pdf?src-supplier=Mouser; ComponentLink2Description: https://datasheet.ciiva.com/12668/rc0805-12668200.pdf?src-supplier=Mouser; ComponentLink3URL: https://datasheet.ciiva.com/15189/getdatasheetpartid-71710-15189925.pdf?src-supplier=Verical; ComponentLink3Description: https://datasheet.ciiva.com/15189/getdatasheetpartid-71710-15189925.pdf?src-supplier=Verical; Pins: 2; Design Item ID: RC0805FR-07200KL; Component Type: Standard; Pin Count: 2; Source: V4-TEL.SCHLIB; Component Type: Resistors
footprint 0805
pins: 1, 2

## CMP-009-00308-1
designator R?  value 330k  (hidden comment: CMP-009-00308-1)
Res Thick Film 0805 330K Ohm 1% 1/8W ±100ppm/°C Molded SMD Paper T/R; Manufacturer: Yageo; Manufacturer Part Number: RC0805FR-07330KL; Power Rating: 125mW; Voltage Rating: 150V; RoHS: Yes; Category: Chip SMD Resistors; Stock 1: 220926; Pricing 1: 1=0.1, 10=0.033, 50=0.033, 100=0.014, 1000=0.007, 10000=0.003 (USD); Case/Package: 0805; Case Code (Metric): 2012; Contact Plating: Tin,Matte; Size Code: 0805; Min Operating Temperature: -55°C; Max Operating Temperature: 155°C; Tolerance: 1%; Package Quantity: 1; Packaging: Tape and Reel; Resistor Type: Thick Film; Number of Terminations: 2; Termination: SMD/SMT; Temperature Coefficient: 100ppm/°C; Max Power Dissipation: 125mW; Features: Moisture Resistant; Series: RC; Resistance Tolerance: 1%; Construction: Rectangular; Technology: THICK FILM; Length: 0.079inch; Width: 0.049inch; Height: 0.024inch; Depth: 1.25mm; Military Standard: Not; Lead Free: Lead Free; RoHS Compliant: Yes; Reach SVHC Compliant: Unknown; ComponentLink1URL: https://datasheet.ciiva.com/2457/pyu-r-int-thick-7-2457090.pdf?src-supplier=Digi-Key; ComponentLink1Description: https://datasheet.ciiva.com/2457/pyu-r-int-thick-7-2457090.pdf?src-supplier=Digi-Key; ComponentLink2URL: https://datasheet.ciiva.com/2457/pyu-r-int-thick-7-2457091.pdf?src-supplier=Digi-Key; ComponentLink2Description: https://datasheet.ciiva.com/2457/pyu-r-int-thick-7-2457091.pdf?src-supplier=Digi-Key; ComponentLink3URL: https://datasheet.ciiva.com/2457/pyu-r-int-thick-7-2457089.pdf?src-supplier=Digi-Key; ComponentLink3Description: https://datasheet.ciiva.com/2457/pyu-r-int-thick-7-2457089.pdf?src-supplier=Digi-Key; ComponentLink4URL: https://datasheet.ciiva.com/12667/rc0805-12667006.pdf?src-supplier=Mouser; ComponentLink4Description: https://datasheet.ciiva.com/12667/rc0805-12667006.pdf?src-supplier=Mouser; ComponentLink5URL: https://datasheet.ciiva.com/7941/444164-7941766.pdf?src-supplier=Element14; ComponentLink5Description: https://datasheet.ciiva.com/7941/444164-7941766.pdf?src-supplier=Element14; ComponentLink6URL: https://datasheet.ciiva.com/7941/444164-7941767.pdf?src-supplier=Element14; ComponentLink6Description: https://datasheet.ciiva.com/7941/444164-7941767.pdf?src-supplier=Element14; ComponentLink7URL: https://datasheet.ciiva.com/17197/rc0805-17197631.pdf?src-supplier=Future+Electronics; ComponentLink7Description: https://datasheet.ciiva.com/17197/rc0805-17197631.pdf?src-supplier=Future+Electronics; Design Item ID: RC0805FR-07330KL; Component Type: Standard; Pin Count: 2; Source: V4-TEL.SCHLIB; Component Type: Resistors
footprint 0805
pins: 1, 2

## CMP-009-00309-1
designator R?  value 510k  (hidden comment: CMP-009-00309-1)
Res Thick Film 0805 510K Ohm 1% 1/8W +/-100ppm/ßC Molded SMD Paper T/R; Manufacturer: Yageo; Manufacturer Part Number: RC0805FR-07510KL; Power Rating: 125mW; Voltage Rating: 150V; Temperature Coefficient: 100ppm/°C; RoHS: Yes; Category: Chip SMD Resistors; Stock 1: 104255; Pricing 1: 1=0.1, 10=0.042, 50=0.042, 100=0.017, 1000=0.007, 10000=0.005 (USD); Mount: Surface Mount; Case/Package: 0805; Case Code (Metric): 2012; Size Code: 0805; Min Operating Temperature: -55°C; Max Operating Temperature: 155°C; Packaging: Tape and Reel; Tolerance: 1%; Termination: SMD/SMT; Voltage Rating (DC): 150V; Features: Moisture Resistant; Series: RC; Max Power Dissipation: 125mW; Number of Terminations: 2; Construction: Rectangular; Technology: THICK FILM; Length: 2mm; Height: 0.5mm; Depth: 1.25mm; Military Standard: Not; Lead Free: Lead Free; RoHS Compliant: Yes; ComponentLink1URL: https://datasheet.ciiva.com/11808/0900766b8106beab-11808278.pdf?src-supplier=Rs; ComponentLink1Description: https://datasheet.ciiva.com/11808/0900766b8106beab-11808278.pdf?src-supplier=Rs; ComponentLink2URL: https://datasheet.ciiva.com/12667/rc0805-12667085.pdf?src-supplier=Mouser; ComponentLink2Description: https://datasheet.ciiva.com/12667/rc0805-12667085.pdf?src-supplier=Mouser; Design Item ID: RC0805FR-07510KL; Component Type: Standard; Pin Count: 2; Source: V4-TEL.SCHLIB; Component Type: Resistors
footprint 0805
pins: 1, 2

## CMP-009-00311-1
designator R?  value 82k  (hidden comment: CMP-009-00311-1)
Res Thick Film 0805 82K Ohm 1% 1/8W ±100ppm/°C Molded SMD Paper T/R; Manufacturer: Yageo; Manufacturer Part Number: RC0805FR-0782KL; Power Rating: 125mW; Voltage Rating: 150V; RoHS: Yes; Category: Chip SMD Resistors; Stock 1: 15360; Pricing 1: 1=0.1, 10=0.029, 50=0.029, 100=0.012, 1000=0.006, 10000=0.003 (USD); Case/Package: 0805; Case Code (Metric): 2012; Weight: 0.000194oz; Contact Plating: Tin,Matte; Size Code: 0805; Min Operating Temperature: -55°C; Max Operating Temperature: 155°C; Tolerance: 1%; Packaging: Tape and Reel; Package Quantity: 1; Resistor Type: Thick Film; Number of Terminations: 2; Termination: SMD/SMT; Temperature Coefficient: 100ppm/°C; Max Power Dissipation: 125mW; Features: Moisture Resistant; Series: RC; Construction: Rectangular; Resistance Tolerance: 1%; Technology: THICK FILM; Length: 2mm; Width: 0.049inch; Height: 0.5mm; Depth: 1.25mm; Military Standard: Not; Lead Free: Lead Free; RoHS Compliant: Yes; Reach SVHC Compliant: Unknown; ComponentLink1URL: https://datasheet.ciiva.com/2457/pyu-r-int-thick-7-2457144.pdf?src-supplier=Digi-Key; ComponentLink1Description: https://datasheet.ciiva.com/2457/pyu-r-int-thick-7-2457144.pdf?src-supplier=Digi-Key; ComponentLink2URL: https://datasheet.ciiva.com/2457/pyu-r-int-thick-7-2457145.pdf?src-supplier=Digi-Key; ComponentLink2Description: https://datasheet.ciiva.com/2457/pyu-r-int-thick-7-2457145.pdf?src-supplier=Digi-Key; ComponentLink3URL: https://datasheet.ciiva.com/2457/pyu-r-int-thick-7-2457143.pdf?src-supplier=Digi-Key; ComponentLink3Description: https://datasheet.ciiva.com/2457/pyu-r-int-thick-7-2457143.pdf?src-supplier=Digi-Key; ComponentLink4URL: https://datasheet.ciiva.com/12577/rc0805-12577609.pdf?src-supplier=Mouser; ComponentLink4Description: https://datasheet.ciiva.com/12577/rc0805-12577609.pdf?src-supplier=Mouser; ComponentLink5URL: https://datasheet.ciiva.com/16747/rc0805-16747260.pdf?src-supplier=Future+Electronics; ComponentLink5Description: https://datasheet.ciiva.com/16747/rc0805-16747260.pdf?src-supplier=Future+Electronics; Design Item ID: RC0805FR-0782KL; Component Type: Standard; Pin Count: 2; Source: V4-TEL.SCHLIB; Component Type: Resistors
footprint 0805
pins: 1, 2
